# Altium footprint library 布洛电子PCB封装库-通用接插件.PcbLib: 103 footprints (part 7 of 7)
Each footprint in its own frame and in the unit in brackets; x right, y up, seen from the top. Pads: shape width x height; smd on the part's side, far side on the other; paste and mask are expansions set on the pad; w line width, h text height; cw(c..) or ccw(c..) is an arc to the next point about the centre after c.
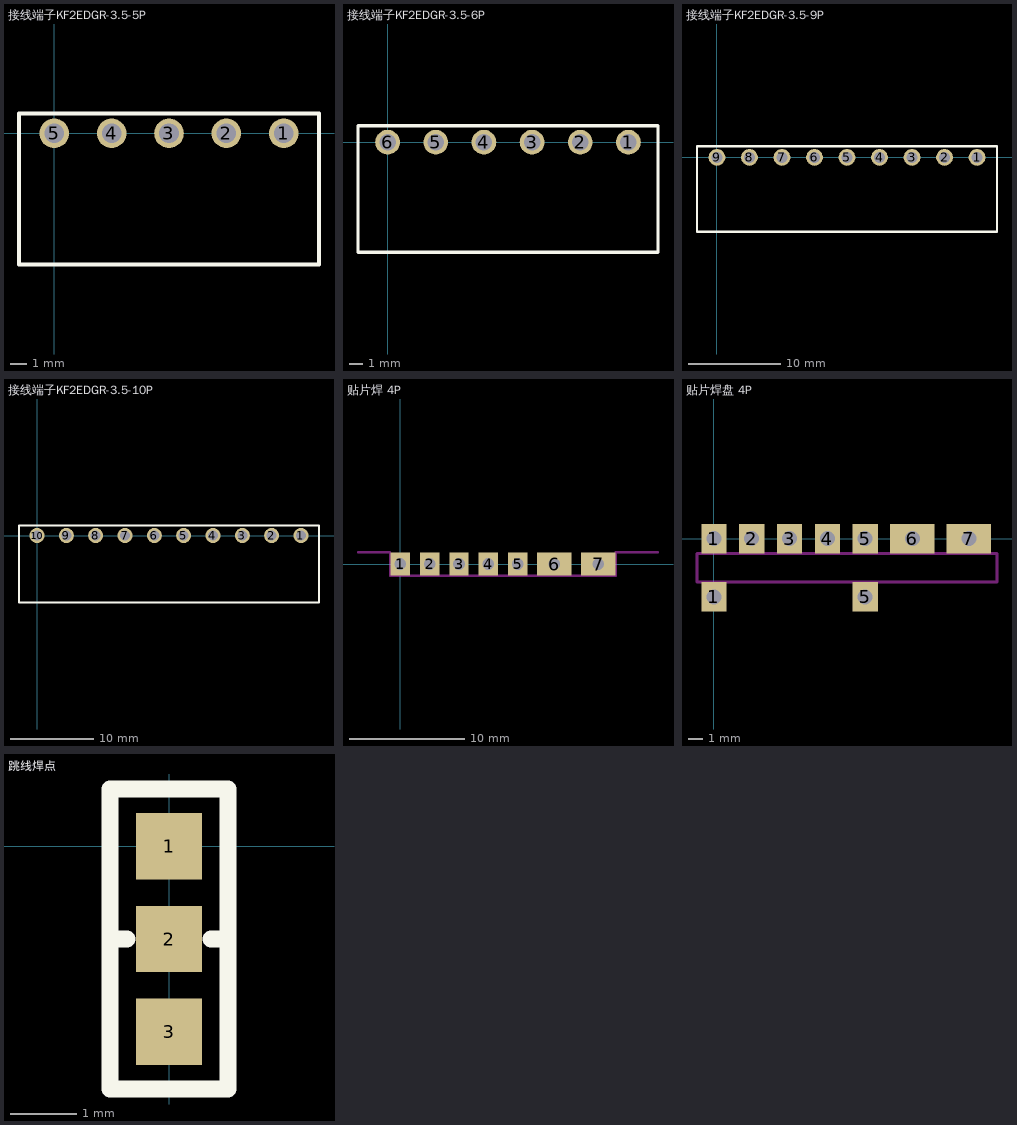
[diagram p6: the footprints below, top view; thin cyan lines are the x and y axes]

## 接线端子KF2EDGR-3.5-5P [mm]
pads (5):
  round 1.8 hole 1.2: 1(14,0) 2(10.5,0) 3(7,0) 4(3.5,0) 5(0,0)
Top Overlay:
  lines w0.254: -2.15,-8 16.15,-8 16.15,1.2 -2.15,1.2 -2.15,-8
3D body: height 7, standoff -3.5, extent 8.034,-7.953 16.434,1.247
3D body: height 7, standoff -3.5, extent 1.1,-7.978 9.5,1.222
3D body: height 7, standoff -3.5, extent -2.362,-7.953 6.038,1.247

## 接线端子KF2EDGR-3.5-6P [mm]
pads (6):
  round 1.8 hole 1.2: 1(17.5,0) 2(14,0) 3(10.5,0) 4(7,0) 5(3.5,0) 6(0,0)
Top Overlay:
  lines w0.254: -2.15,-8 -2.15,1.2 19.65,1.2 19.65,-8 -2.15,-8
3D body: height 7, standoff -3.5, extent -2.15,-8 6.25,1.2
3D body: height 7, standoff -3.5, extent 4.379,-7.924 12.779,1.276
3D body: height 7, standoff -3.5, extent 11.248,-7.924 19.648,1.276

## 接线端子KF2EDGR-3.5-9P [mm]
pads (9):
  round 1.8 hole 1.2: 1(28,0) 2(24.5,0) 3(21,0) 4(17.5,0) 5(14,0) 6(10.5,0) 7(7,0) 8(3.5,0) 9(0,0)
Top Overlay:
  lines w0.254: -2.15,-8 30.15,-8 30.15,1.2 -2.15,1.2 -2.15,-8
3D body: height 7, standoff -3.5, extent 21.748,-7.924 30.148,1.276
3D body: height 7, standoff -3.5, extent 14.879,-7.924 23.279,1.276
3D body: height 7, standoff -3.5, extent 8.011,-7.924 16.411,1.276
3D body: height 7, standoff -3.5, extent 1.142,-7.924 9.542,1.276
3D body: height 7, standoff -3.5, extent -2.15,-8 6.25,1.2

## 接线端子KF2EDGR-3.5-10P [mm]
pads (10):
  round 1.8 hole 1.2: 1(31.5,0) 2(28,0) 3(24.5,0) 4(21,0) 5(17.5,0) 6(14,0) 7(10.5,0) 8(7,0) 9(3.5,0) 10(0,0)
Top Overlay:
  lines w0.254: -2.15,-8 -2.15,0 -2.15,1.2 33.65,1.2 33.65,-8 -2.15,-8
3D body: height 7, standoff -3.5, extent -2.226,-7.924 6.174,1.276
3D body: height 7, standoff -3.5, extent 4.642,-7.924 13.042,1.276
3D body: height 7, standoff -3.5, extent 11.511,-7.924 19.911,1.276
3D body: height 7, standoff -3.5, extent 18.379,-7.924 26.779,1.276
3D body: height 7, standoff -3.5, extent 25.248,-7.924 33.648,1.276

## 贴片焊 4P [mm]
pads (7):
  rect 1.7x2 hole 1.016: 1(0,0) 2(2.562,0) 3(5.125,0) 4(7.687,0) 5(10.25,0)
  rect 3x2 hole 1.016: 6(13.439,0) 7(17.272,0)
Keep-Out Layer:
  lines w0.203: -3.683,1.016 -0.889,1.016 -0.889,-1.016 18.796,-1.016 18.796,1.016 22.479,1.016

## 贴片焊盘 4P [mm]
pads (9):
  rect 1.7x2 hole 1.016: 1(0,-3.937) 1(0,0) 2(2.562,0) 3(5.125,0) 4(7.687,0) 5(10.25,-3.937) 5(10.25,0)
  rect 3x2 hole 1.016: 6(13.439,0) 7(17.272,0)
Keep-Out Layer:
  lines w0.203: -1.143,-2.921 19.177,-2.921 19.177,-1.016 -1.143,-1.016 -1.143,-2.921

## 跳线焊点 [mm]
pads (3):
  rect 1x1 smd: 1(0,0) 2(0,-1.397) 3(0,-2.794)
Top Overlay:
  lines w0.254: -0.889,-1.397 -0.635,-1.397 ; 0.635,-1.397 0.889,-1.397 ; -0.889,-3.658 -0.889,0.864 0.889,0.864 0.889,-3.658 -0.889,-3.658